# Altium footprint library RNG_Footprints.PcbLib: 134 footprints (part 6 of 9)
Each footprint in its own frame and in the unit in brackets; x right, y up, seen from the top. Pads: shape width x height; smd on the part's side, far side on the other; paste and mask are expansions set on the pad; w line width, h text height; cw(c..) or ccw(c..) is an arc to the next point about the centre after c.
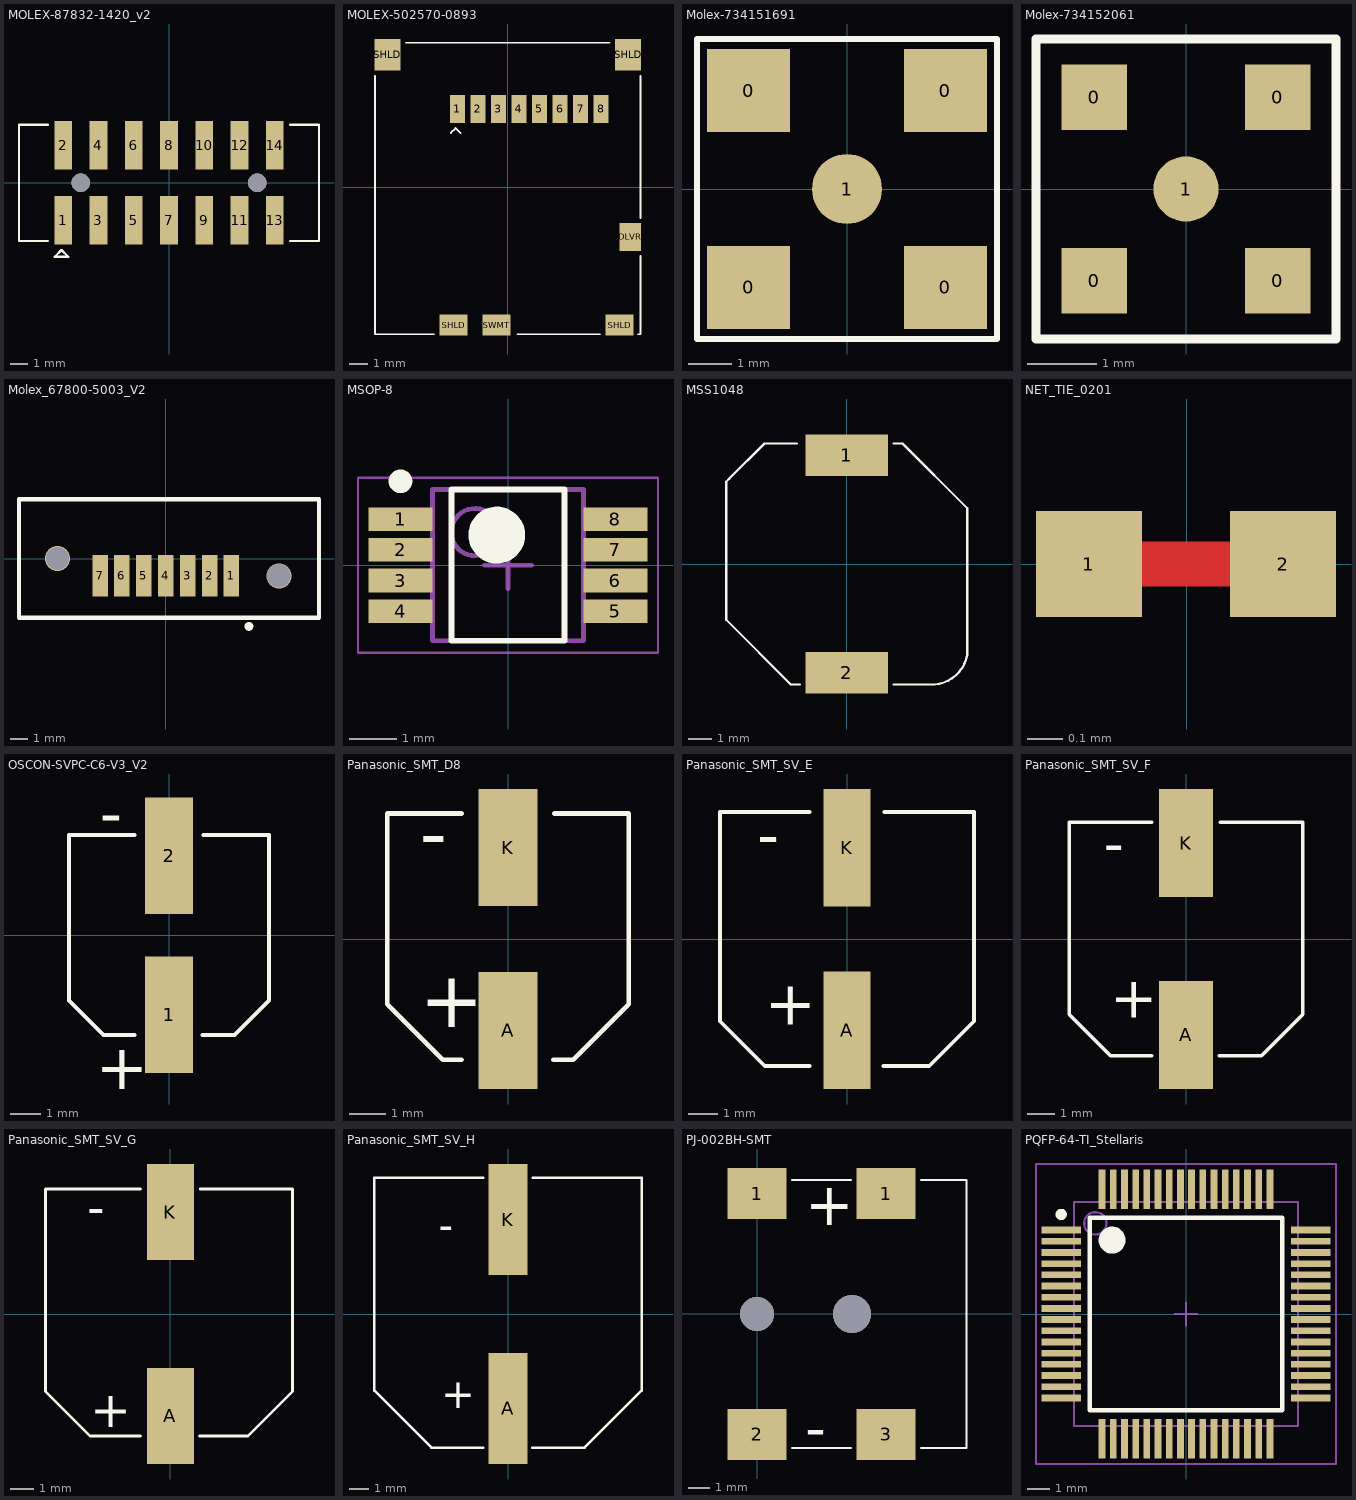
[diagram p5: the footprints below, top view; thin cyan lines are the x and y axes]

## MOLEX-87832-1420_v2 [mm] "Molex 87832-1420 Shrouded SMT Header 2.0mm 7x2"
height 7.6
pads (14):
  rect 1x2.75 smd: 1(-6,-2.125) 2(-6,2.125) 3(-4,-2.125) 4(-4,2.125) 5(-2,-2.125) 6(-2,2.125) 7(0,-2.125) 8(0,2.125) 9(2,-2.125) 10(2,2.125) 11(4,-2.125) 12(4,2.125) 13(6,-2.125) 14(6,2.125)
via 5,0 diameter 1.05 hole 1.05
via -5,0 diameter 1.05 hole 1.05
Top Overlay:
  lines w0.127: -6.858,-3.302 -8.509,-3.302 -8.509,3.302 -6.858,3.302 ; 6.858,-3.302 8.509,-3.302 8.509,3.302 6.858,3.302 ; -6.477,-4.191 -5.715,-4.191 -6.096,-3.81 -6.477,-4.191
3D body "878321420.stp": height 7.61, standoff -0.74, extent -8.325,-3.15 8.325,3.15

## MOLEX-502570-0893 [mm] "Molex MicroSD Memory Card Connector"
height 1.8
pads (14):
  rect 0.8x1.5 smd: 1(-2.7,4.2) 2(-1.6,4.2) 3(-0.5,4.2) 4(0.6,4.2) 5(1.7,4.2) 6(2.8,4.2) 7(3.9,4.2) 8(5,4.2)
  rect 1.15x1.5 smd: DLVR(6.575,-2.65)
  rect 1.4x1.7 smd: SHLD(-6.45,7.1) SHLD(6.45,7.1)
  rect 1.5x1.15 smd: SHLD(-2.9,-7.375) SHLD(6,-7.375) SWMT(-0.6,-7.375)
Top Overlay:
  lines w0.1: -7.112,5.969 -7.112,-7.874 -3.937,-7.874 ; -5.461,7.747 5.461,7.747 ; -3.048,2.921 -2.794,3.175 -2.54,2.921 ; 0.508,-7.874 4.953,-7.874 ; 6.985,-7.874 7.112,-7.874 7.112,-3.683 ; 7.112,-1.651 7.112,5.969
3D body "5025700893.stp": height 1.81, standoff 0.01, extent -6.9,-7.747 6.9,7.753

## Molex-734151691 [mm] "Molex MCX PCB SMT Jack 50 Ohm"
height 5.9
pads (5):
  rect 1.9x1.9 smd: 0(-2.25,-2.25) 0(-2.25,2.25) 0(2.25,-2.25) 0(2.25,2.25)
  round 1.6 smd: 1(0,0)
Top Overlay:
  lines w0.127: -3.429,-3.429 -3.429,3.429 3.429,3.429 3.429,-3.429 -3.429,-3.429
3D body "User Library-MCX_SMD_v1.STEP": height 5.9, standoff 0, extent -2.95,-2.95 2.95,2.95

## Molex-734152061 [mm] "Molex MMCX Jack SMT 50 Ohms"
height 5.15
pads (5):
  rect 0.94x0.94 smd: 0(-1.32,-1.32) 0(-1.32,1.32) 0(1.32,-1.32) 0(1.32,1.32)
  round 0.94 smd: 1(0,0)
Top Overlay:
  lines w0.127: -2.159,-2.159 2.159,-2.159 2.159,2.159 -2.159,2.159 -2.159,-2.159
3D body "User Library-Molex_MMCX_734152061.STEP": height 5, standoff 0, extent -1.75,-1.75 1.75,1.75

## Molex_67800-5003_V2 [mm] "SATA SMT Vertical Shrounded Connector 67800-5003"
height 8.4
pads (7):
  rect 0.9x2.4 smd: 1(3.81,-1) 2(2.54,-1) 3(1.27,-1) 4(0,-1) 5(-1.27,-1) 6(-2.54,-1) 7(-3.81,-1)
via 6.56,-1 diameter 1.45 hole 1.35
via -6.27,0 diameter 1.45 hole 1.35
Top Overlay:
  circle w0.254: c4.826,-3.937 r0.127
  lines w0.254: -8.509,-3.429 -8.509,3.429 8.89,3.429 8.89,-3.429 -8.509,-3.429
3D body "678005003.stp": height 8.41, standoff -2.64, extent -8.27,-3.225 8.63,3.225

## MSOP-8 [mm] "TSOP, 8-Leads, Body 3.00x3.00mm, Pitch 0.65mm, IPC Medium Density"
height 1.1
pads (8):
  rect 1.35x0.5 smd: 1(-2.275,0.975) 2(-2.275,0.325) 3(-2.275,-0.325) 4(-2.275,-0.975) 5(2.275,-0.975) 6(2.275,-0.325) 7(2.275,0.325) 8(2.275,0.975)
Top Overlay:
  circle w0.6: c-0.238,0.637 r0.3
  circle w0.25: c-2.275,1.775 r0.125
  lines w0.125: -1.2,-1.6 1.2,-1.6 1.2,1.6 -1.2,1.6 -1.2,-1.6
Mechanical 13:
  circle w0.1: c-0.7,0.7 r0.5
  lines w0.1: -1.6,-1.6 1.6,-1.6 1.6,1.6 -1.6,1.6 -1.6,-1.6
Mechanical 15:
  lines w0.05: -3.175,-1.85 3.175,-1.85 3.175,1.85 -3.175,1.85 -3.175,-1.85
  lines w0.1: -0.5,0 0.5,0 ; 0,-0.5 0,0.5
3D body "User Library-EMSOP-8 Natl Semi MUY08A.STEP": height 1.11, standoff 0.01, extent -2.5,-1.476 2.5,1.524

## MSS1048 [mm] "MS1048 Coilcraft Shielded Power Inductors"
height 5.1
pads (2):
  rect 3.56x1.78 smd: 1(0,4.7) 2(0,-4.7)
Top Overlay:
  lines w0.1: -2.159,5.207 -3.556,5.207 -5.08,3.683 -5.207,3.556 -5.207,-2.413 -2.413,-5.207 -2.032,-5.207 ; 2.032,-5.207 3.81,-5.207 ; 2.032,5.207 2.413,5.207 5.207,2.413 5.207,-3.937
  lines w0.102: 3.81,-5.207 ccw(c3.668,-3.647) 5.207,-3.937
3D body "Coilcraft-MSS1048-DEFAULT.STEP": height 5.11, standoff 0.01, extent -5.1,-5.15 5.1,5.15

## NET_TIE_0201 [mm] "NET TIE"
pads (2):
  rect 0.3x0.3 smd paste-0.3 mask-0.3: 1(-0.277,0) 2(0.273,0)
Top Layer:
  lines w0.127: -0.277,0 0.273,0

## OSCON-SVPC-C6-V3_V2 [mm] "Electrolytic SMT Cap, Os-Con Size C6 SVPC Series"
height 5.9
pads (2):
  rect 1.6x3.85 smd: 1(0,-2.625) 2(0,2.625)
Top Overlay:
  lines w0.127: -1.143,-3.302 -2.159,-3.302 -3.302,-2.159 -3.302,3.302 -1.143,3.302 ; 1.111,-3.302 2.159,-3.302 3.302,-2.159 3.302,3.302 1.143,3.302
  text "+" at -2.413,-5.08 h1.52
  text "-" at -2.286,3.302 h1.52
3D body: height 5.9, standoff 1, extent -3.274,-3.293 3.3,3.294
3D body: height 1, standoff 0.1, extent -3.302,-3.302 3.302,3.302

## Panasonic_SMT_D8 [mm] "Panasonic Body D8 Electrolytic SMT Cap"
height 6.1
pads (2):
  rect 1.6x3.2 smd paste-0.075: A(0,-2.5) K(0,2.5)
Top Overlay:
  lines w0.127: -1.27,-3.302 -1.778,-3.302 -3.302,-1.778 -3.302,3.429 -1.27,3.429 ; 1.238,-3.302 1.778,-3.302 3.302,-1.778 3.302,3.429 1.27,3.429
  text "-" at -2.413,2.159 h1.52
  text "+" at -2.413,-2.413 h1.52
3D body "User Library-ALU-D8.STEP": height 7.7, standoff 0, extent -3.3,-3.5 3.3,3.5

## Panasonic_SMT_SV_E [mm] "Panasonic Type V, Series S, Body E Electrolytic SMT Cap"
height 6.5
pads (2):
  rect 1.6x4 smd paste-0.075: A(0,-3.1) K(0,3.1)
Top Overlay:
  lines w0.127: -1.27,-4.318 -2.794,-4.318 -4.318,-2.794 -4.318,4.318 -1.27,4.318 ; 1.238,-4.318 2.794,-4.318 4.318,-2.794 4.318,4.318 1.27,4.318
  text "+" at -2.794,-2.921 h1.52
  text "-" at -3.048,2.794 h1.52
3D body "User Library-ALU-E.STEP": height 6.21, standoff 0.01, extent -4.15,-4.5 4.15,4.5

## Panasonic_SMT_SV_F [mm] "Panasonic Type V, Series S, Body F Electrolytic SMT Cap"
height 10.5
pads (2):
  rect 2x4 smd paste-0.075: A(0,-3.55) K(0,3.55)
Top Overlay:
  lines w0.127: -1.27,-4.318 -2.794,-4.318 -4.318,-2.794 -4.318,4.318 -1.27,4.318 ; 1.238,-4.318 2.794,-4.318 4.318,-2.794 4.318,4.318 1.27,4.318
  text "+" at -2.794,-2.921 h1.52
  text "-" at -3.048,2.794 h1.52
3D body "User Library-ALU-F.STEP": height 10.21, standoff 0.01, extent -4.15,-4.95 4.15,4.95

## Panasonic_SMT_SV_G [mm] "Panasonic Type V, Series S, Body G Electrolytic SMT Cap"
height 10.8
pads (2):
  rect 2x4.1 smd paste-0.075: A(0,-4.35) K(0,4.35)
Top Overlay:
  lines w0.127: -1.27,-5.207 -3.429,-5.207 -5.334,-3.302 -5.334,5.334 -1.27,5.334 ; 1.238,-5.207 3.302,-5.207 5.207,-3.302 5.207,5.334 1.27,5.334
  text "+" at -3.429,-4.826 h1.52
  text "-" at -3.556,3.81 h1.52
3D body "User Library-ALU-G.STEP": height 10.21, standoff 0.01, extent -5.15,-5.8 5.15,5.8

## Panasonic_SMT_SV_H [mm] "Panasonic Type V, Series S, Body H Electrolytic SMT Cap"
height 13.8
pads (2):
  rect 2x5.7 smd paste-0.075: A(0,-4.85) K(0,4.85)
Top Overlay:
  lines w0.127: -1.27,-6.858 -3.937,-6.858 -6.858,-3.937 -6.858,6.985 -1.27,6.985 ; 1.238,-6.858 3.937,-6.858 6.858,-3.937 6.858,6.985 1.27,6.985
  text "-" at -3.556,3.81 h1.52
  text "+" at -3.429,-4.826 h1.52
3D body "SW3dPS-capacitor size H13.STEP": height 13.5, standoff -0.01, extent -6.75,-6.9 6.75,6.9

## PJ-002BH-SMT [mm] "CUI DC Power Jack SMT, 2.5mm/6.5mm"
height 11
pads (4):
  rect 2.8x2.4 smd: 1(0,5.7) 1(6.1,5.7) 2(0,-5.7) 3(6.1,-5.7)
via 4.5,0 diameter 1.8 hole 1.8
via 0,0 diameter 1.6 hole 1.6
Top Overlay:
  lines w0.1: 1.651,-6.35 4.445,-6.35 ; 1.651,6.35 4.445,6.35 ; 7.747,-6.35 9.906,-6.35 9.906,6.35 7.747,6.35
  text "+" at 2.286,4.191 h2
  text "-" at 2.286,-6.35 h2
3D body "pj-002bh-smt.stp": height 11.21, standoff -0.99, extent -5,-6.3 9.8,6.3

## PQFP-64-TI_Stellaris [mm] "TSQFP, 64-Leads, Body 12.2x12.2mm (max), Pitch 0.50mm, IPC Medium Density"
height 1.6
pads (64):
  rect 1.75x0.3 smd: 1(-5.575,3.75) 2(-5.575,3.25) 3(-5.575,2.75) 4(-5.575,2.25) 5(-5.575,1.75) 6(-5.575,1.25) 7(-5.575,0.75) 8(-5.575,0.25) 9(-5.575,-0.25) 10(-5.575,-0.75) 11(-5.575,-1.25) 12(-5.575,-1.75) 13(-5.575,-2.25) 14(-5.575,-2.75) 15(-5.575,-3.25) 16(-5.575,-3.75) 33(5.575,-3.75) 34(5.575,-3.25) 35(5.575,-2.75) 36(5.575,-2.25) 37(5.575,-1.75) 38(5.575,-1.25) 39(5.575,-0.75) 40(5.575,-0.25) 41(5.575,0.25) 42(5.575,0.75) 43(5.575,1.25) 44(5.575,1.75) 45(5.575,2.25) 46(5.575,2.75) 47(5.575,3.25) 48(5.575,3.75)
  rect 0.3x1.75 smd: 17(-3.75,-5.575) 18(-3.25,-5.575) 19(-2.75,-5.575) 20(-2.25,-5.575) 21(-1.75,-5.575) 22(-1.25,-5.575) 23(-0.75,-5.575) 24(-0.25,-5.575) 25(0.25,-5.575) 26(0.75,-5.575) 27(1.25,-5.575) 28(1.75,-5.575) 29(2.25,-5.575) 30(2.75,-5.575) 31(3.25,-5.575) 32(3.75,-5.575) 49(3.75,5.575) 50(3.25,5.575) 51(2.75,5.575) 52(2.25,5.575) 53(1.75,5.575) 54(1.25,5.575) 55(0.75,5.575) 56(0.25,5.575) 57(-0.25,5.575) 58(-0.75,5.575) 59(-1.25,5.575) 60(-1.75,5.575) 61(-2.25,5.575) 62(-2.75,5.575) 63(-3.25,5.575) 64(-3.75,5.575)
Top Overlay:
  circle w0.6: c-3.3,3.3 r0.3
  circle w0.25: c-5.575,4.45 r0.125
  lines w0.2: -4.3,-4.3 4.3,-4.3 4.3,4.3 -4.3,4.3 -4.3,-4.3
Mechanical 13:
  circle w0.1: c-4.05,4.05 r0.5
  lines w0.1: -5,-5 5,-5 5,5 -5,5 -5,-5
Mechanical 15:
  lines w0.1: -0.5,0 0.5,0 ; 0,-0.5 0,0.5 ; -6.7,-6.7 6.7,-6.7 6.7,6.7 -6.7,6.7 -6.7,-6.7
3D body: height 1.6, standoff 0.08, extent -5,-5 5,5